# Altium footprint library PcbLib_Discrete.PcbLib: 118 footprints (part 5 of 8)
Each footprint in its own frame and in the unit in brackets; x right, y up, seen from the top. Pads: shape width x height; smd on the part's side, far side on the other; paste and mask are expansions set on the pad; w line width, h text height; cw(c..) or ccw(c..) is an arc to the next point about the centre after c.
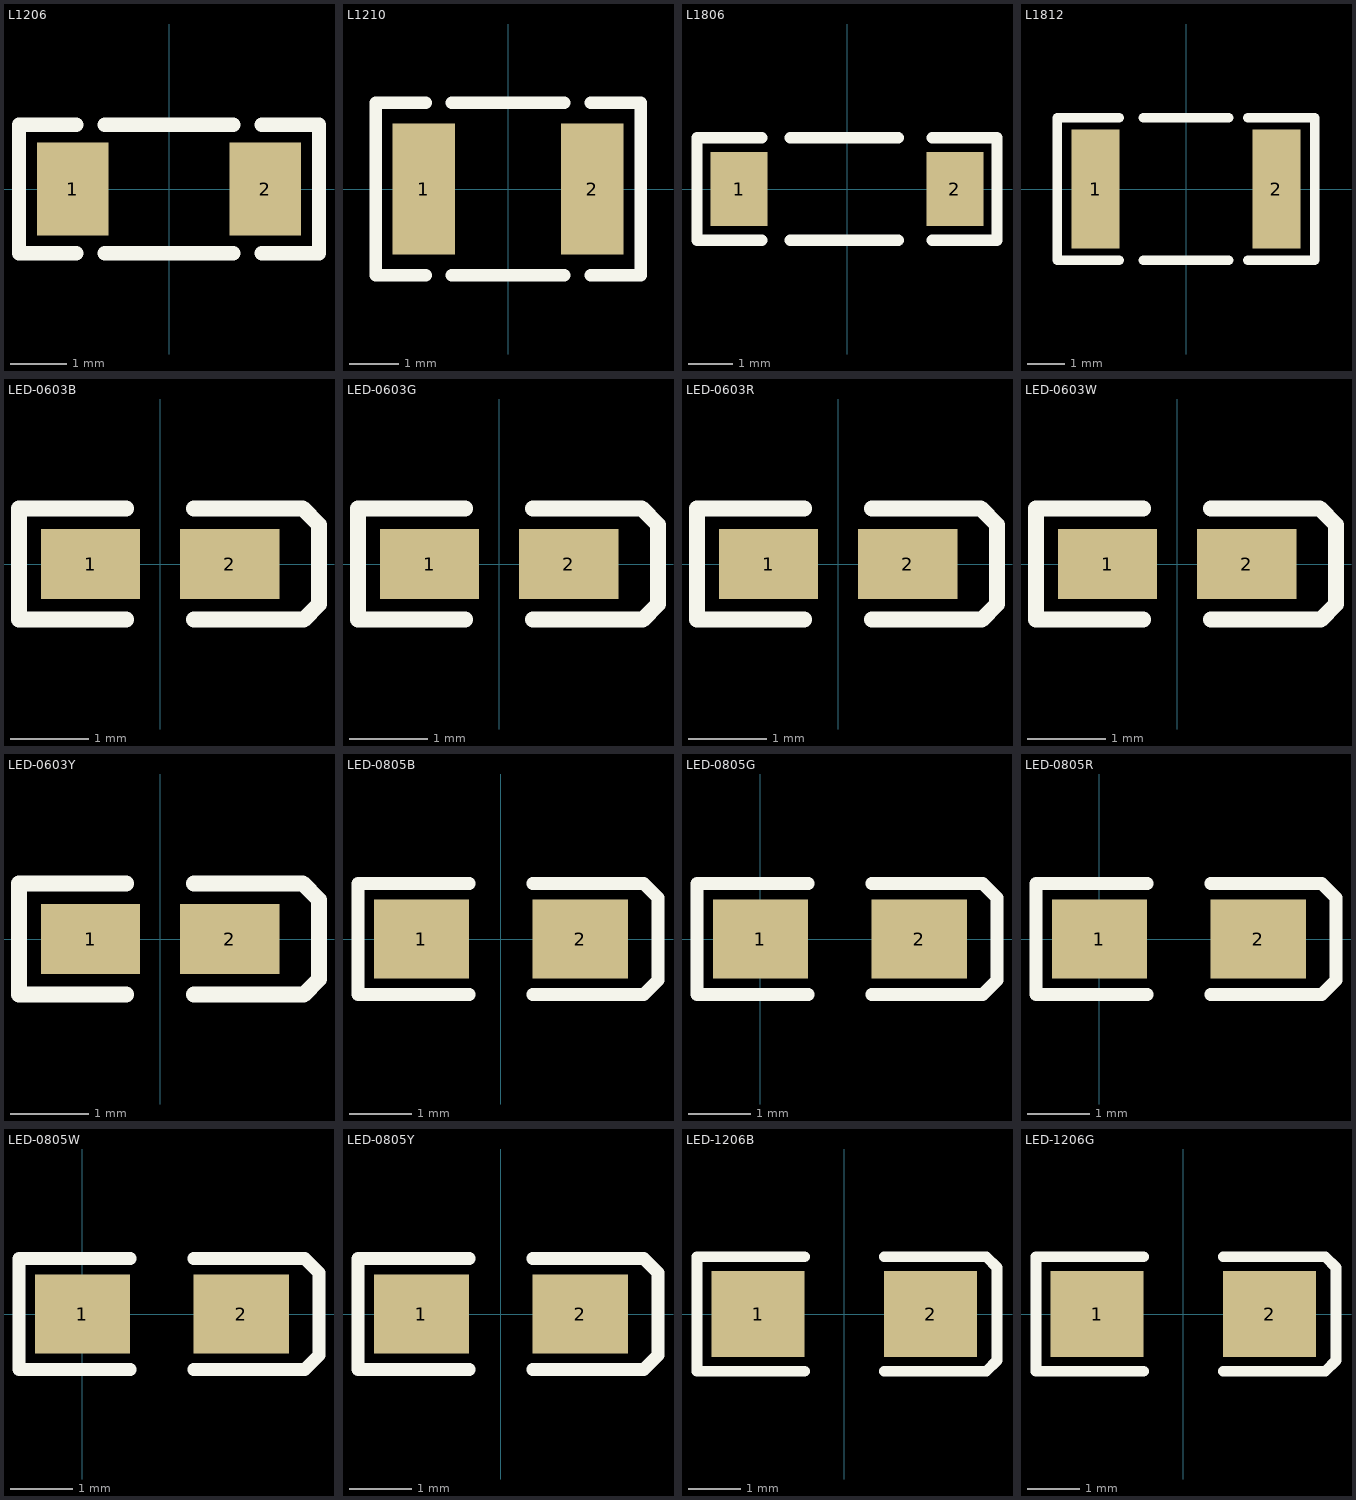
[diagram p4: the footprints below, top view; thin cyan lines are the x and y axes]

## L1206 [mil]
pads (2):
  rect 50x65 smd: 1(-67.5,0) 2(67.5,0)
Top Overlay:
  lines w10: -65,-45 -105,-45 -105,45 -65,45 ; -45,-45 45,-45 ; -45,45 45,45 ; 65,-45 105,-45 105,45 65,45
3D body "1206L.STEP": height 35.43, standoff 0, extent -62.99,-30 62.99,33

## L1210 [mil]
pads (2):
  rect 50x105 smd: 1(-67.5,0) 2(67.5,0)
Top Overlay:
  lines w10: -66,-69 -106,-69 -106,69 -66,69 ; -45,-69 45,-69 ; -45,69 45,69 ; 66,-69 106,-69 106,69 66,69
3D body "1210L.STEP": height 51.18, standoff 0, extent -67.99,-48.43 57.99,50

## L1806 [mil]
pads (2):
  rect 50x65 smd: 1(-95,0) 2(95,0)
Top Overlay:
  lines w10: -75,-45 -132,-45 -132,45 -75,45 ; -50,-45 45,-45 ; -50,45 45,45 ; 75,-45 132,-45 132,45 75,45
3D body "1806.STEP": height 62.99, standoff -0.19, extent -88.58,-31.5 88.58,31.5

## L1812 [mil]
pads (2):
  rect 50x125 smd: 1(-95,0) 2(95,0)
Top Overlay:
  lines w10: -70,-75 -135,-75 -135,75 -70,75 ; -45,-75 45,-75 ; -45,75 45,75 ; 65,-75 135,-75 135,75 65,75
3D body "1812L.STEP": height 59.06, standoff 0, extent -85,-62.99 92.16,62.99

## LED-0603B [mil]
pads (2):
  rect 50x35 smd: 1(-35,0) 2(35,0)
Top Overlay:
  lines w8: -17,-28 -71,-28 -71,-26 -71,28 -70,28 -17,28 ; 17,-28 72.25,-28 80,-20.25 80,19.74 71.74,28 71,28 17,28
3D body "18.STEP": height 23.82, standoff -0.04, extent -31.5,-15.79 31.49,15.79

## LED-0603G [mil]
pads (2):
  rect 50x35 smd: 1(-35,0) 2(35,0)
Top Overlay:
  lines w8: -17,-28 -71,-28 -71,-26 -71,28 -70,28 -17,28 ; 17,-28 72.25,-28 80,-20.25 80,19.74 71.74,28 ; 17,28 71,28
3D body "17.STEP": height 23.82, standoff -0.04, extent -31.5,-15.79 31.49,15.79

## LED-0603R [mil]
pads (2):
  rect 50x35 smd: 1(-35,0) 2(35,0)
Top Overlay:
  lines w8: -17,-28 -71,-28 -71,-26 -71,28 -70,28 -17,28 ; 17,-28 72.25,-28 80,-20.25 80,19.74 71.74,28 ; 17,28 71,28
3D body "16.STEP": height 23.82, standoff -0.04, extent -33,-15.79 30,15.79

## LED-0603W [mil]
pads (2):
  rect 50x35 smd: 1(-35,0) 2(35,0)
Top Overlay:
  lines w8: -17,-28 -71,-28 -71,-26 -71,28 -70,28 -17,28 ; 17,-28 72.25,-28 80,-20.25 80,19.74 71.74,28 ; 17,28 71,28
3D body "15.STEP": height 23.82, standoff -0.04, extent -31.5,-15.79 31.49,15.79

## LED-0603Y [mil]
pads (2):
  rect 50x35 smd: 1(-35,0) 2(35,0)
Top Overlay:
  lines w8: -17,-28 -71,-28 -71,-26 -71,28 -70,28 -17,28 ; 17,-28 72.25,-28 80,-20.25 80,19.74 71.74,28 ; 17,28 71,28
3D body "14.STEP": height 23.82, standoff -0.04, extent -31.5,-15.92 31.49,15.92

## LED-0805B [mil]
pads (2):
  rect 60x50 smd: 1(-50,0) 2(50,0)
Top Overlay:
  lines w8: -20,-35 -90,-35 -90,35 -20,35 ; 20,-35 90,-35 99,-26 99,26 90,35 20,35
3D body "13.STEP": height 31.69, standoff -0.04, extent -40,-24.64 38.74,24.64

## LED-0805G [mil]
pads (2):
  rect 60x50 smd: 1(0,0) 2(100,0)
Top Overlay:
  lines w8: 30,-35 -40,-35 -40,35 30,35 ; 70,-35 140,-35 149,-26 149,26 140,35 70,35
3D body "12.STEP": height 31.69, standoff -0.04, extent 10.63,-24.65 89.37,24.65

## LED-0805R [mil]
pads (2):
  rect 60x50 smd: 1(0,0) 2(100,0)
Top Overlay:
  lines w8: 30,-35 -40,-35 -40,35 30,35 ; 70,-35 140,-35 149,-26 149,26 140,35 70,35
3D body "11.STEP": height 31.69, standoff -0.04, extent 10.63,-24.65 89.37,24.65

## LED-0805W [mil]
pads (2):
  rect 60x50 smd: 1(0,0) 2(100,0)
Top Overlay:
  lines w8: 30,-35 -40,-35 -40,35 30,35 ; 70,-35 140,-35 149,-26 149,26 140,35 70,35
3D body "10.STEP": height 31.69, standoff -0.04, extent 10.64,-24.65 89.38,24.65

## LED-0805Y [mil]
pads (2):
  rect 60x50 smd: 1(-50,0) 2(50,0)
Top Overlay:
  lines w8: -20,-35 -90,-35 -90,35 -20,35 ; 20,-35 90,-35 99,-26 99,26 90,35 20,35
3D body "m.STEP": height 31.69, standoff -0.04, extent -39.37,-24.65 39.37,24.65

## LED-1206B [mil]
pads (2):
  rect 70x65 smd: 1(-65,0) 2(65,0)
Top Overlay:
  lines w8: -30,-43 -111,-43 -111,43 -109,43 -30,43 ; 30,-43 107,-43 115,-35 115,35 107,43 30,43
3D body "8.STEP": height 39.57, standoff -0.04, extent -68.03,-31.54 58.03,31.54

## LED-1206G [mil]
pads (2):
  rect 70x65 smd: 1(-65,0) 2(65,0)
Top Overlay:
  lines w8: -111,43 -111,-43 -30,-43 ; -109,43 -30,43 ; 30,-43 107,-43 115,-35 115,35 107,43 30,43
3D body "7.STEP": height 39.57, standoff -0.04, extent -58.03,-31.53 68.03,31.53